# Altium footprint library Module MISC.PcbLib: 27 footprints (part 1 of 2)
Each footprint in its own frame and in the unit in brackets; x right, y up, seen from the top. Pads: shape width x height; smd on the part's side, far side on the other; paste and mask are expansions set on the pad; w line width, h text height; cw(c..) or ccw(c..) is an arc to the next point about the centre after c.
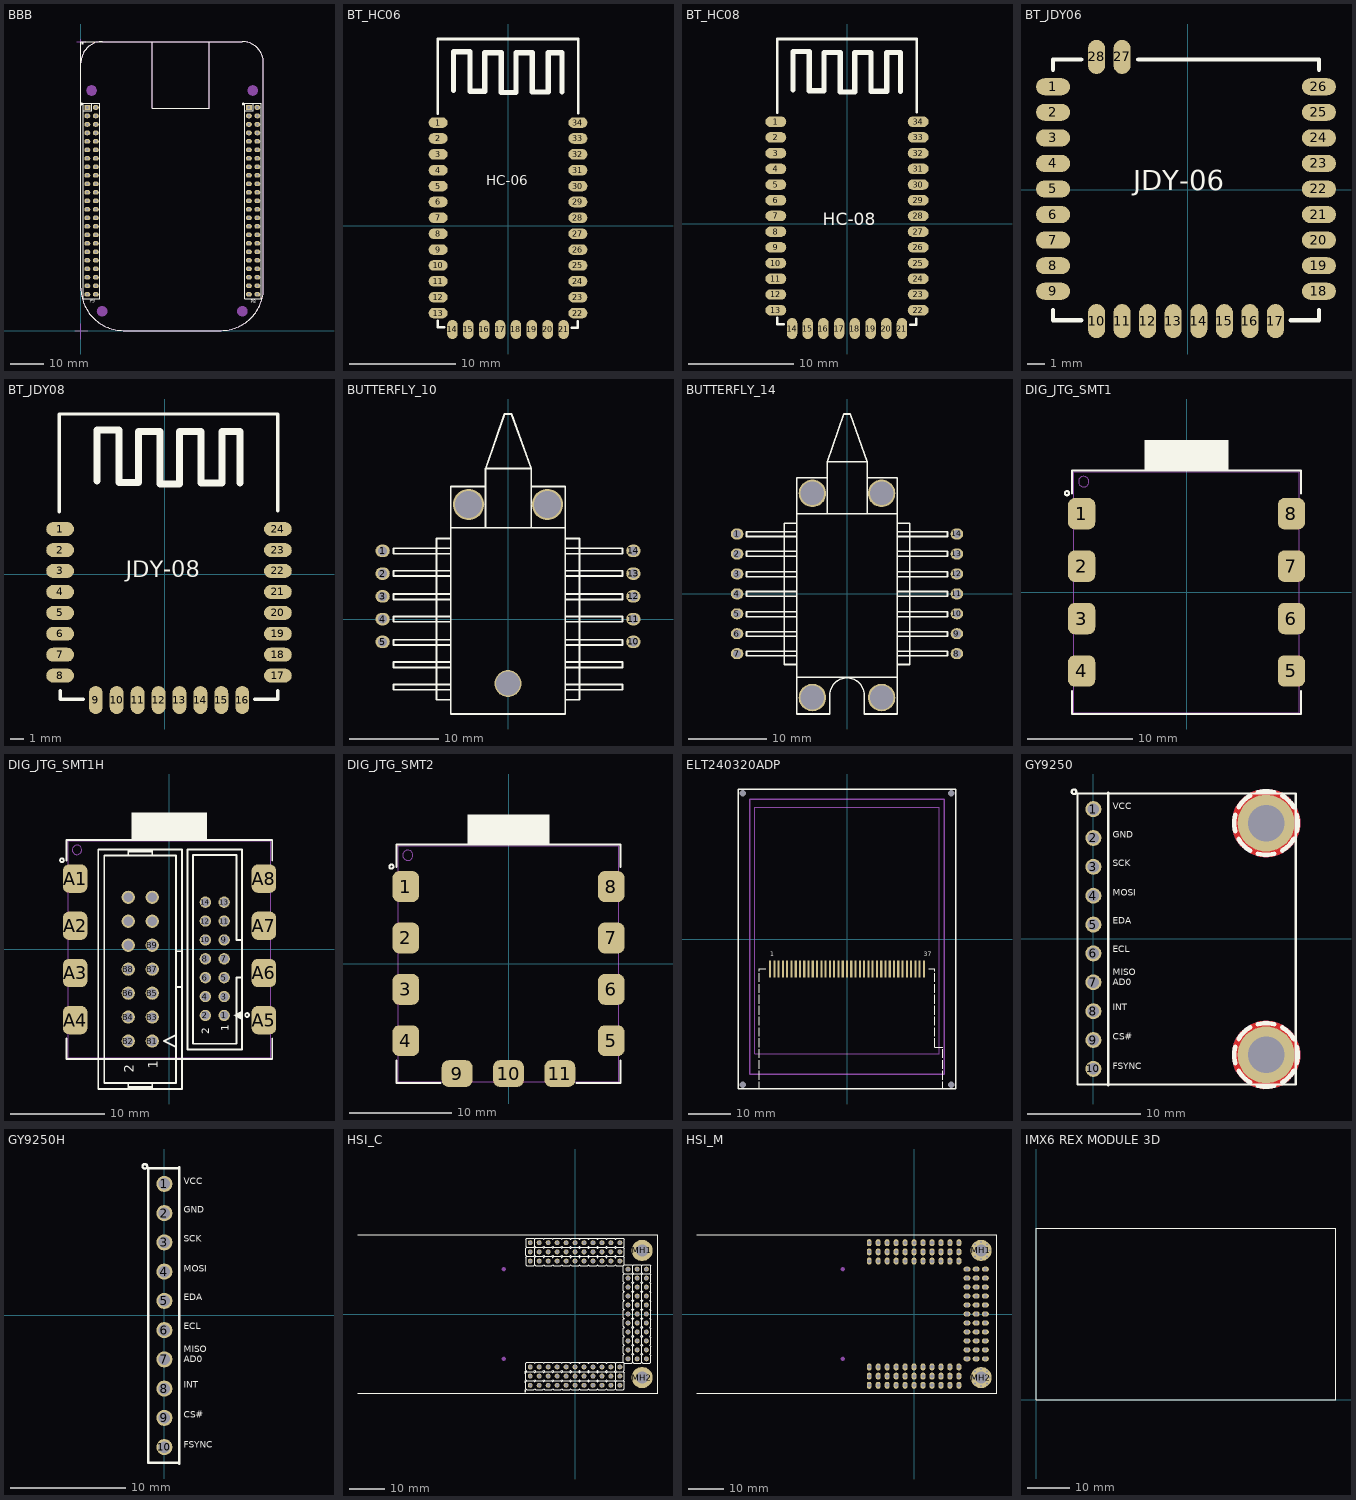
[diagram p0: the footprints below, top view; thin cyan lines are the x and y axes]

## BBB [mm] "BeagleBoneBlack Board"
pads (188):
  round 1 on Mech1: 1(1.93,66.74) 1(50.23,66.74) 2(4.47,66.74) 2(52.77,66.74) 3(1.93,64.2) 3(50.23,64.2) 4(4.47,64.2) 4(52.77,64.2) 5(1.93,61.66) 5(50.23,61.66) 6(4.47,61.66) 6(52.77,61.66) 7(1.93,59.12) 7(50.23,59.12) 8(4.47,59.12) 8(52.77,59.12) 9(1.93,56.58) 9(50.23,56.58) 10(4.47,56.58) 10(52.77,56.58) 11(1.93,54.04) 11(50.23,54.04) 12(4.47,54.04) 12(52.77,54.04) 13(1.93,51.5) 13(50.23,51.5) 14(4.47,51.5) 14(52.77,51.5) 15(1.93,48.96) 15(50.23,48.96) 16(4.47,48.96) 16(52.77,48.96) 17(1.93,46.42) 17(50.23,46.42) 18(4.47,46.42) 18(52.77,46.42) 19(1.93,43.88) 19(50.23,43.88) 20(4.47,43.88) 20(52.77,43.88) 21(1.93,41.34) 21(50.23,41.34) 22(4.47,41.34) 22(52.77,41.34) 23(1.93,38.8) 23(50.23,38.8) 24(4.47,38.8) 24(52.77,38.8) 25(1.93,36.26) 25(50.23,36.26) 26(4.47,36.26) 26(52.77,36.26) 27(1.93,33.72) 27(50.23,33.72) 28(4.47,33.72) 28(52.77,33.72) 29(1.93,31.18) 29(50.23,31.18) 30(4.47,31.18) 30(52.77,31.18) 31(1.93,28.64) 31(50.23,28.64) 32(4.47,28.64) 32(52.77,28.64) 33(1.93,26.1) 33(50.23,26.1) 34(4.47,26.1) 34(52.77,26.1) 35(1.93,23.56) 35(50.23,23.56) 36(4.47,23.56) 36(52.77,23.56) 37(1.93,21.02) 37(50.23,21.02) 38(4.47,21.02) 38(52.77,21.02) 39(1.93,18.48) 39(50.23,18.48) 40(4.47,18.48) 40(52.77,18.48) 41(1.93,15.94) 41(50.23,15.94) 42(4.47,15.94) 42(52.77,15.94) 43(1.93,13.4) 43(50.23,13.4) 44(4.47,13.4) 44(52.77,13.4) 45(1.93,10.86) 45(50.23,10.86) 46(4.47,10.86) 46(52.77,10.86)
  rect 1.8x1.4 / inner rect 1.2x1.2 / far side rect 1.4x1.4 hole 0.8: A1(1.93,66.74) B1(50.23,66.74)
  oval 1.8x1.4 / inner round 1.2 / far side round 1.4 hole 0.8: A2(4.47,66.74) A3(1.93,64.2) A4(4.47,64.2) A5(1.93,61.66) A6(4.47,61.66) A7(1.93,59.12) A8(4.47,59.12) A9(1.93,56.58) A10(4.47,56.58) A11(1.93,54.04) A12(4.47,54.04) A13(1.93,51.5) A14(4.47,51.5) A15(1.93,48.96) A16(4.47,48.96) A17(1.93,46.42) A18(4.47,46.42) A19(1.93,43.88) A20(4.47,43.88) A21(1.93,41.34) A22(4.47,41.34) A23(1.93,38.8) A24(4.47,38.8) A25(1.93,36.26) A26(4.47,36.26) A27(1.93,33.72) A28(4.47,33.72) A29(1.93,31.18) A30(4.47,31.18) A31(1.93,28.64) A32(4.47,28.64) A33(1.93,26.1) A34(4.47,26.1) A35(1.93,23.56) A36(4.47,23.56) A37(1.93,21.02) A38(4.47,21.02) A39(1.93,18.48) A40(4.47,18.48) A41(1.93,15.94) A42(4.47,15.94) A43(1.93,13.4) A44(4.47,13.4) A45(1.93,10.86) A46(4.47,10.86) B2(52.77,66.74) B3(50.23,64.2) B4(52.77,64.2) B5(50.23,61.66) B6(52.77,61.66) B7(50.23,59.12) B8(52.77,59.12) B9(50.23,56.58) B10(52.77,56.58) B11(50.23,54.04) B12(52.77,54.04) B13(50.23,51.5) B14(52.77,51.5) B15(50.23,48.96) B16(52.77,48.96) B17(50.23,46.42) B18(52.77,46.42) B19(50.23,43.88) B20(52.77,43.88) B21(50.23,41.34) B22(52.77,41.34) B23(50.23,38.8) B24(52.77,38.8) B25(50.23,36.26) B26(52.77,36.26) B27(50.23,33.72) B28(52.77,33.72) B29(50.23,31.18) B30(52.77,31.18) B31(50.23,28.64) B32(52.77,28.64) B33(50.23,26.1) B34(52.77,26.1) B35(50.23,23.56) B36(52.77,23.56) B37(50.23,21.02) B38(52.77,21.02) B39(50.23,18.48) B40(52.77,18.48) B41(50.23,15.94) B42(52.77,15.94) B43(50.23,13.4) B44(52.77,13.4) B45(50.23,10.86) B46(52.77,10.86)
  round 3.2 on Mech1: ""(3.2,71.8) ""(6.35,5.8) ""(48.3,5.8) ""(51.4,71.8)
Top Overlay:
  circle w0.2: c0.505,85.915 r0.2
  circle w0.2: c0.2,67.8 r0.2
  circle w0.2: c48.5,67.8 r0.2
  lines w0.2: 0.7,65.8 3.2,65.8 3.2,68 ; 21.3,86.3 21.3,66.5 38.4,66.5 38.4,86.3 ; 49,65.8 51.5,65.8 51.5,68 ; 0,80.05 cw(c6.35,80.05) 6.35,86.4 ; 0,80.05 0,86.4 6.35,86.4 ; 0,80.05 0,12.74 ccw(c12.7,12.74) 12.7,0.04 41.91,0.04 ccw(c41.91,12.74) 54.61,12.74 54.61,80.05 ccw(c48.26,80.05) 48.26,86.4 6.35,86.4 ; 0.7,9.6 0.7,68 5.7,68 5.7,9.6 0.7,9.6 ; 49,9.6 49,68 54,68 54,9.6 49,9.6
  text "P9" at 2.605,8.315 h1
  text "P8" at 50.805,8.115 h1
Bottom Overlay:
  circle w0.2: c0.2,67.85 r0.2
  circle w0.2: c48.5,67.85 r0.2
  lines w0.2: 0.7,65.8 3.1,65.8 3.1,68 ; 49,65.8 51.4,65.8 51.4,68 ; 0.7,9.6 5.7,9.6 5.7,68 0.7,68 0.7,9.6 ; 49,9.6 54,9.6 54,68 49,68 49,9.6
  text "P9" at 4.005,8.315 h1
  text "P8" at 52.205,8.115 h1
Mechanical 1:
  lines w0.2: -1.9,0 2.1,0 ; -1.3,86.4 1.3,86.4 ; 0,-2.5 0,2 ; 0,85.6 0,87.2 ; 21.3,86.3 21.3,66.5 38.4,66.5 38.4,86.3 ; 0,12.74 ccw(c12.7,12.74) 12.7,0.04 41.91,0.04 ccw(c41.91,12.74) 54.61,12.74 54.61,80.05 ccw(c48.26,80.05) 48.26,86.4 6.35,86.4 ccw(c6.35,80.05) 0,80.05 0,12.74
3D body "PIN.STEP": height 8.43, standoff -2.49, extent 51.5,9.59 54.04,12.13
3D body "PIN.STEP": height 8.43, standoff -2.49, extent 48.96,9.59 51.5,12.13
3D body "PIN.STEP": height 8.43, standoff -2.49, extent 51.5,65.47 54.04,68.01
3D body "PIN_mid.STEP": height 8.43, standoff -2.49, extent 48.96,60.39 51.5,62.93
3D body "PIN_mid.STEP": height 8.43, standoff -2.49, extent 48.96,57.85 51.5,60.39
3D body "PIN_mid.STEP": height 8.43, standoff -2.49, extent 48.96,55.31 51.5,57.85
3D body "PIN_mid.STEP": height 8.43, standoff -2.49, extent 48.96,52.77 51.5,55.31
3D body "PIN_mid.STEP": height 8.43, standoff -2.49, extent 48.96,50.23 51.5,52.77
3D body "PIN_mid.STEP": height 8.43, standoff -2.49, extent 48.96,47.69 51.5,50.23
3D body "PIN_mid.STEP": height 8.43, standoff -2.49, extent 48.96,45.15 51.5,47.69
3D body "PIN_mid.STEP": height 8.43, standoff -2.49, extent 48.96,42.61 51.5,45.15
3D body "PIN_mid.STEP": height 8.43, standoff -2.49, extent 48.96,40.07 51.5,42.61
3D body "PIN_mid.STEP": height 8.43, standoff -2.49, extent 48.96,37.53 51.5,40.07
3D body "PIN_mid.STEP": height 8.43, standoff -2.49, extent 48.96,34.99 51.5,37.53
3D body "PIN_mid.STEP": height 8.43, standoff -2.49, extent 48.96,32.45 51.5,34.99
3D body "PIN_mid.STEP": height 8.43, standoff -2.49, extent 48.96,29.91 51.5,32.45
3D body "PIN_mid.STEP": height 8.43, standoff -2.49, extent 48.96,27.37 51.5,29.91
3D body "PIN_mid.STEP": height 8.43, standoff -2.49, extent 48.96,24.83 51.5,27.37
3D body "PIN_mid.STEP": height 8.43, standoff -2.49, extent 48.96,22.29 51.5,24.83
3D body "PIN_mid.STEP": height 8.43, standoff -2.49, extent 48.96,19.75 51.5,22.29
3D body "PIN_mid.STEP": height 8.43, standoff -2.49, extent 48.96,17.21 51.5,19.75
3D body "PIN_mid.STEP": height 8.43, standoff -2.49, extent 48.96,14.67 51.5,17.21
3D body "PIN_mid.STEP": height 8.43, standoff -2.49, extent 48.96,62.93 51.5,65.47
3D body "PIN_mid.STEP": height 8.43, standoff -2.49, extent 51.5,62.93 54.04,65.47
3D body "PIN_mid.STEP": height 8.43, standoff -2.49, extent 51.5,60.39 54.04,62.93
3D body "PIN_mid.STEP": height 8.43, standoff -2.49, extent 51.5,57.85 54.04,60.39
3D body "PIN_mid.STEP": height 8.43, standoff -2.49, extent 51.5,55.31 54.04,57.85
3D body "PIN_mid.STEP": height 8.43, standoff -2.49, extent 51.5,52.77 54.04,55.31
3D body "PIN_mid.STEP": height 8.43, standoff -2.49, extent 51.5,50.23 54.04,52.77
3D body "PIN_mid.STEP": height 8.43, standoff -2.49, extent 51.5,47.69 54.04,50.23
3D body "PIN_mid.STEP": height 8.43, standoff -2.49, extent 51.5,45.15 54.04,47.69
3D body "PIN_mid.STEP": height 8.43, standoff -2.49, extent 51.5,42.61 54.04,45.15
3D body "PIN_mid.STEP": height 8.43, standoff -2.49, extent 51.5,40.07 54.04,42.61
3D body "PIN_mid.STEP": height 8.43, standoff -2.49, extent 51.5,37.53 54.04,40.07
3D body "PIN_mid.STEP": height 8.43, standoff -2.49, extent 51.5,34.99 54.04,37.53
3D body "PIN_mid.STEP": height 8.43, standoff -2.49, extent 51.5,32.45 54.04,34.99
3D body "PIN_mid.STEP": height 8.43, standoff -2.49, extent 51.5,29.91 54.04,32.45
3D body "PIN_mid.STEP": height 8.43, standoff -2.49, extent 51.5,27.37 54.04,29.91
3D body "PIN_mid.STEP": height 8.43, standoff -2.49, extent 51.5,24.83 54.04,27.37
3D body "PIN_mid.STEP": height 8.43, standoff -2.49, extent 51.5,22.29 54.04,24.83
3D body "PIN_mid.STEP": height 8.43, standoff -2.49, extent 51.5,19.75 54.04,22.29
3D body "PIN_mid.STEP": height 8.43, standoff -2.49, extent 51.5,17.21 54.04,19.75
3D body "PIN_mid.STEP": height 8.43, standoff -2.49, extent 51.5,14.67 54.04,17.21
3D body "PIN.STEP": height 8.43, standoff -2.49, extent 48.96,65.47 51.5,68.01
3D body "PIN.STEP": height 8.43, standoff -2.49, extent 48.96,12.13 51.5,14.67
3D body "PIN.STEP": height 8.43, standoff -2.49, extent 51.5,12.13 54.04,14.67
3D body "PIN.STEP": height 8.43, standoff -2.49, extent 3.2,12.13 5.74,14.67
3D body "PIN.STEP": height 8.43, standoff -2.49, extent 0.66,12.13 3.2,14.67
3D body "PIN.STEP": height 8.43, standoff -2.49, extent 0.66,65.47 3.2,68.01
3D body "PIN_mid.STEP": height 8.43, standoff -2.49, extent 3.2,14.67 5.74,17.21
3D body "PIN_mid.STEP": height 8.43, standoff -2.49, extent 3.2,17.21 5.74,19.75
3D body "PIN_mid.STEP": height 8.43, standoff -2.49, extent 3.2,19.75 5.74,22.29
3D body "PIN_mid.STEP": height 8.43, standoff -2.49, extent 3.2,22.29 5.74,24.83
3D body "PIN_mid.STEP": height 8.43, standoff -2.49, extent 3.2,24.83 5.74,27.37
3D body "PIN_mid.STEP": height 8.43, standoff -2.49, extent 3.2,27.37 5.74,29.91
3D body "PIN_mid.STEP": height 8.43, standoff -2.49, extent 3.2,29.91 5.74,32.45
3D body "PIN_mid.STEP": height 8.43, standoff -2.49, extent 3.2,32.45 5.74,34.99
3D body "PIN_mid.STEP": height 8.43, standoff -2.49, extent 3.2,34.99 5.74,37.53
3D body "PIN_mid.STEP": height 8.43, standoff -2.49, extent 3.2,37.53 5.74,40.07
3D body "PIN_mid.STEP": height 8.43, standoff -2.49, extent 3.2,40.07 5.74,42.61
3D body "PIN_mid.STEP": height 8.43, standoff -2.49, extent 3.2,42.61 5.74,45.15
3D body "PIN_mid.STEP": height 8.43, standoff -2.49, extent 3.2,45.15 5.74,47.69
3D body "PIN_mid.STEP": height 8.43, standoff -2.49, extent 3.2,47.69 5.74,50.23
3D body "PIN_mid.STEP": height 8.43, standoff -2.49, extent 3.2,50.23 5.74,52.77
3D body "PIN_mid.STEP": height 8.43, standoff -2.49, extent 3.2,52.77 5.74,55.31
3D body "PIN_mid.STEP": height 8.43, standoff -2.49, extent 3.2,55.31 5.74,57.85
3D body "PIN_mid.STEP": height 8.43, standoff -2.49, extent 3.2,57.85 5.74,60.39
3D body "PIN_mid.STEP": height 8.43, standoff -2.49, extent 3.2,60.39 5.74,62.93
3D body "PIN_mid.STEP": height 8.43, standoff -2.49, extent 3.2,62.93 5.74,65.47
3D body "PIN_mid.STEP": height 8.43, standoff -2.49, extent 0.66,62.93 3.2,65.47
3D body "PIN_mid.STEP": height 8.43, standoff -2.49, extent 0.66,14.67 3.2,17.21
3D body "PIN_mid.STEP": height 8.43, standoff -2.49, extent 0.66,17.21 3.2,19.75
3D body "PIN_mid.STEP": height 8.43, standoff -2.49, extent 0.66,19.75 3.2,22.29
3D body "PIN_mid.STEP": height 8.43, standoff -2.49, extent 0.66,22.29 3.2,24.83
3D body "PIN_mid.STEP": height 8.43, standoff -2.49, extent 0.66,24.83 3.2,27.37
3D body "PIN_mid.STEP": height 8.43, standoff -2.49, extent 0.66,27.37 3.2,29.91
3D body "PIN_mid.STEP": height 8.43, standoff -2.49, extent 0.66,29.91 3.2,32.45
3D body "PIN_mid.STEP": height 8.43, standoff -2.49, extent 0.66,32.45 3.2,34.99
3D body "PIN_mid.STEP": height 8.43, standoff -2.49, extent 0.66,34.99 3.2,37.53
3D body "PIN_mid.STEP": height 8.43, standoff -2.49, extent 0.66,37.53 3.2,40.07
3D body "PIN_mid.STEP": height 8.43, standoff -2.49, extent 0.66,40.07 3.2,42.61
3D body "PIN_mid.STEP": height 8.43, standoff -2.49, extent 0.66,42.61 3.2,45.15
3D body "PIN_mid.STEP": height 8.43, standoff -2.49, extent 0.66,45.15 3.2,47.69
3D body "PIN_mid.STEP": height 8.43, standoff -2.49, extent 0.66,47.69 3.2,50.23
3D body "PIN_mid.STEP": height 8.43, standoff -2.49, extent 0.66,50.23 3.2,52.77
3D body "PIN_mid.STEP": height 8.43, standoff -2.49, extent 0.66,52.77 3.2,55.31
3D body "PIN_mid.STEP": height 8.43, standoff -2.49, extent 0.66,55.31 3.2,57.85
3D body "PIN_mid.STEP": height 8.43, standoff -2.49, extent 0.66,57.85 3.2,60.39
3D body "PIN_mid.STEP": height 8.43, standoff -2.49, extent 0.66,60.39 3.2,62.93
3D body "PIN.STEP": height 8.43, standoff -2.49, extent 3.2,65.47 5.74,68.01
3D body "PIN.STEP": height 8.43, standoff -2.49, extent 0.66,9.59 3.2,12.13
3D body "PIN.STEP": height 8.43, standoff -2.49, extent 3.2,9.59 5.74,12.13
3D body "BEAGLEBONE_BLACK.STEP": height 1.34, standoff -18.03, extent -0.06,-1.625 54.6,88.825

## BT_HC06 [mm] "Bluetooth HC-06"
pads (34):
  oval 1.8x1 smd: 1(-6.6,9.75) 2(-6.6,8.25) 3(-6.6,6.75) 4(-6.6,5.25) 5(-6.6,3.75) 6(-6.6,2.25) 7(-6.6,0.75) 8(-6.6,-0.75) 9(-6.6,-2.25) 10(-6.6,-3.75) 11(-6.6,-5.25) 12(-6.6,-6.75) 13(-6.6,-8.25) 22(6.6,-8.25) 23(6.6,-6.75) 24(6.6,-5.25) 25(6.6,-3.75) 26(6.6,-2.25) 27(6.6,-0.75) 28(6.6,0.75) 29(6.6,2.25) 30(6.6,3.75) 31(6.6,5.25) 32(6.6,6.75) 33(6.6,8.25) 34(6.6,9.75)
  oval 1x1.8 smd: 14(-5.25,-9.8) 15(-3.75,-9.8) 16(-2.25,-9.8) 17(-0.75,-9.8) 18(0.75,-9.8) 19(2.25,-9.8) 20(3.75,-9.8) 21(5.25,-9.8)
Top Overlay:
  lines w0.25: -6.65,-9 -6.65,-9.6 -6.05,-9.6 ; -6.65,10.6 -6.65,17.65 6.65,17.65 6.65,10.65 ; 6.05,-9.65 6.6,-9.65 6.6,-9.05
  lines w0.5: -5.15,12.8 -5.15,16.45 -3.6,16.45 -3.6,12.7 -2.2,12.7 -2.2,16.35 -0.65,16.35 -0.65,12.6 0.75,12.6 0.75,16.35 2.3,16.35 2.3,12.65 3.8,12.65 3.8,16.35 5.1,16.35 5.1,12.65
  text "HC-06" at -2.05,3.5 h1.6
3D body "BLUETOOTH-HC-06 Package.STEP": height 4.3, standoff 0, extent -6.5,-9.5 6.5,17.5

## BT_HC08 [mm] "Bluetooth HC-08"
pads (34):
  oval 2x1 smd: 1(-6.8,9.75) 2(-6.8,8.25) 3(-6.8,6.75) 4(-6.8,5.25) 5(-6.8,3.75) 6(-6.8,2.25) 7(-6.8,0.75) 8(-6.8,-0.75) 9(-6.8,-2.25) 10(-6.8,-3.75) 11(-6.8,-5.25) 12(-6.8,-6.75) 13(-6.8,-8.25) 22(6.8,-8.25) 23(6.8,-6.75) 24(6.8,-5.25) 25(6.8,-3.75) 26(6.8,-2.25) 27(6.8,-0.75) 28(6.8,0.75) 29(6.8,2.25) 30(6.8,3.75) 31(6.8,5.25) 32(6.8,6.75) 33(6.8,8.25) 34(6.8,9.75)
  oval 1x2 smd: 14(-5.25,-10) 15(-3.75,-10) 16(-2.25,-10) 17(-0.75,-10) 18(0.75,-10) 19(2.25,-10) 20(3.75,-10) 21(5.25,-10)
Top Overlay:
  lines w0.25: -6.65,-9 -6.65,-9.6 -6.05,-9.6 ; -6.65,10.6 -6.65,17.65 6.65,17.65 6.65,10.65 ; 6.05,-9.65 6.6,-9.65 6.6,-9.05
  lines w0.5: -5.15,12.8 -5.15,16.45 -3.6,16.45 -3.6,12.7 -2.2,12.7 -2.2,16.35 -0.65,16.35 -0.65,12.6 0.75,12.6 0.75,16.35 2.3,16.35 2.3,12.65 3.8,12.65 3.8,16.35 5.1,16.35 5.1,12.65
  text "HC-08" at -2.3,-0.5 h2
3D body "BLUETOOTH-HC-06 Package.STEP": height 4.3, standoff 0, extent -6.5,-9.5 6.5,17.5

## BT_JDY06 [mm]
pads (28):
  oval 2x1 smd: 1(-7.9,6.05) 2(-7.9,4.55) 3(-7.9,3.05) 4(-7.9,1.55) 5(-7.9,0.05) 6(-7.9,-1.45) 7(-7.9,-2.95) 8(-7.9,-4.45) 9(-7.9,-5.95) 18(7.7,-5.95) 19(7.7,-4.45) 20(7.7,-2.95) 21(7.7,-1.45) 22(7.7,0.05) 23(7.7,1.55) 24(7.7,3.05) 25(7.7,4.55) 26(7.7,6.05)
  oval 1x2 smd: 10(-5.35,-7.7) 11(-3.85,-7.7) 12(-2.35,-7.7) 13(-0.85,-7.7) 14(0.65,-7.7) 15(2.15,-7.7) 16(3.65,-7.7) 17(5.15,-7.7) 27(-3.85,7.8) 28(-5.35,7.8)
Top Overlay:
  lines w0.25: -7.9,-7.65 -7.9,-7.05 ; -7.9,7.05 -7.9,7.65 ; -7.85,-7.65 -6.25,-7.65 ; -7.85,7.65 -6.25,7.65 ; -2.9,7.65 7.65,7.65 ; 6.05,-7.65 7.65,-7.65 ; 7.7,-7.65 7.7,-7.05 ; 7.7,7.05 7.7,7.65
  text "JDY-06" at -3.2,-0.4 h2
3D body: height 2, standoff 0, extent -7.606,-7.3 7.406,7.4

## BT_JDY08 [mm]
pads (24):
  oval 2x1 smd: 1(-7.5,3.25) 2(-7.5,1.75) 3(-7.5,0.25) 4(-7.5,-1.25) 5(-7.5,-2.75) 6(-7.5,-4.25) 7(-7.5,-5.75) 8(-7.5,-7.25) 17(8.1,-7.25) 18(8.1,-5.75) 19(8.1,-4.25) 20(8.1,-2.75) 21(8.1,-1.25) 22(8.1,0.25) 23(8.1,1.75) 24(8.1,3.25)
  oval 1x2 smd: 9(-4.95,-9) 10(-3.45,-9) 11(-1.95,-9) 12(-0.45,-9) 13(1.05,-9) 14(2.55,-9) 15(4.05,-9) 16(5.55,-9)
Top Overlay:
  lines w0.25: -7.55,4.5 -7.55,11.5 8.1,11.5 8.1,4.55 ; -7.5,-8.95 -7.5,-8.35 ; -7.45,-8.95 -5.85,-8.95 ; 6.45,-8.95 8.05,-8.95 ; 8.1,-8.95 8.1,-8.35
  lines w0.5: -4.85,6.7 -4.85,10.35 -3.3,10.35 -3.3,6.6 -1.9,6.6 -1.9,10.25 -0.35,10.25 -0.35,6.5 1.05,6.5 1.05,10.25 2.6,10.25 2.6,6.55 4.1,6.55 4.1,10.25 5.4,10.25 5.4,6.55
  text "JDY-08" at -2.8,-0.6 h2
3D body "JDY-08.stp": height 2.08, standoff 0, extent -7.2,-8.7 7.811,11.188

## BUTTERFLY_10 [mm] "Butterfly Laser Module 10pin"
pads (13):
  oval 1.6x1.4 / inner round 1.4 / far side oval 2.2x1.4 hole 1: 1(-14,7.62) 2(-14,5.08) 3(-14,2.54) 4(-14,0) 5(-14,-2.54) 10(14,-2.54) 11(14,0) 12(14,2.54) 13(14,5.08) 14(14,7.62)
  round 3.5 / inner round 3.5 / far side round 5 hole 3: ""(-4.4,12.8) ""(4.4,12.8)
  round 3 / inner round 3 / far side round 5 hole 2.7: ""(0,-7.2)
Top Overlay:
  lines w0.2: -6.4,-9 -8,-9 -8,9 -6.4,9 ; -6.4,-7.9 -12.8,-7.9 -12.8,-7.3 -6.4,-7.3 ; -6.4,-5.4 -12.8,-5.4 -12.8,-4.8 -6.4,-4.8 ; -6.4,-2.9 -12.8,-2.9 -12.8,-2.3 -6.4,-2.3 ; -6.4,-0.3 -12.8,-0.3 -12.8,0.3 -6.4,0.3 ; -6.4,2.2 -12.8,2.2 -12.8,2.8 -6.4,2.8 ; -6.4,4.8 -12.8,4.8 -12.8,5.4 -6.4,5.4 ; -6.4,7.3 -12.8,7.3 -12.8,7.9 -6.4,7.9 ; -6.4,10.2 6.4,10.2 ; -2.5,10.2 -2.5,16.8 ; -2.5,14.8 -6.4,14.8 -6.4,-10.6 6.4,-10.6 6.4,14.8 2.6,14.8 ; 2.6,10.2 2.6,16.8 ; 6.4,-9 8,-9 8,9 6.4,9 ; 6.4,-7.9 12.8,-7.9 12.8,-7.3 6.4,-7.3 ; 6.4,-5.4 12.8,-5.4 12.8,-4.8 6.4,-4.8 ; 6.4,-2.9 12.8,-2.9 12.8,-2.3 6.4,-2.3 ; 6.4,-0.3 12.8,-0.3 12.8,0.3 6.4,0.3 ; 6.4,2.2 12.8,2.2 12.8,2.8 6.4,2.8 ; 6.4,4.8 12.8,4.8 12.8,5.4 6.4,5.4 ; 6.4,7.3 12.8,7.3 12.8,7.9 6.4,7.9 ; -2.5,16.8 -0.4,22.9 0.4,22.9 2.6,16.8 ; -2.5,16.8 2.6,16.8
3D body "User Library-Butterfly-14-Lead.step": height 9.51, standoff 0, extent -26.65,-15.2 26.65,40.7

## BUTTERFLY_14 [mm] "Butterfly Laser Module 14pin"
pads (18):
  oval 1.6x1.4 / inner round 1.4 / far side oval 2.2x1.4 hole 1: 1(-14,7.62) 2(-14,5.08) 3(-14,2.54) 4(-14,0) 5(-14,-2.54) 6(-14,-5.08) 7(-14,-7.62) 8(14,-7.62) 9(14,-5.08) 10(14,-2.54) 11(14,0) 12(14,2.54) 13(14,5.08) 14(14,7.62)
  round 3.5 / inner round 3.5 / far side round 5 hole 3: ""(-4.4,-13.2) ""(-4.4,12.8) ""(4.4,-13.2) ""(4.4,12.8)
Top Overlay:
  lines w0.2: -6.4,-10.6 6.4,-10.6 ; -6.4,-9 -8,-9 -8,9 -6.4,9 ; -6.4,-7.9 -12.8,-7.9 -12.8,-7.3 -6.4,-7.3 ; -6.4,-5.4 -12.8,-5.4 -12.8,-4.8 -6.4,-4.8 ; -6.4,-2.9 -12.8,-2.9 -12.8,-2.3 -6.4,-2.3 ; -6.4,-0.3 -12.8,-0.3 -12.8,0.3 -6.4,0.3 ; -6.4,2.2 -12.8,2.2 -12.8,2.8 -6.4,2.8 ; -6.4,4.8 -12.8,4.8 -12.8,5.4 -6.4,5.4 ; -6.4,7.3 -12.8,7.3 -12.8,7.9 -6.4,7.9 ; -6.4,10.2 6.4,10.2 ; -2.5,10.2 -2.5,16.8 ; -2.5,14.8 -6.4,14.8 -6.4,-15.3 -2.2,-15.3 -2.2,-12.9 cw(c0,-12.9) 2.2,-12.9 2.2,-15.3 6.4,-15.3 6.4,14.8 2.6,14.8 ; 2.6,10.2 2.6,16.8 ; 6.4,-9 8,-9 8,9 6.4,9 ; 6.4,-7.9 12.8,-7.9 12.8,-7.3 6.4,-7.3 ; 6.4,-5.4 12.8,-5.4 12.8,-4.8 6.4,-4.8 ; 6.4,-2.9 12.8,-2.9 12.8,-2.3 6.4,-2.3 ; 6.4,-0.3 12.8,-0.3 12.8,0.3 6.4,0.3 ; 6.4,2.2 12.8,2.2 12.8,2.8 6.4,2.8 ; 6.4,4.8 12.8,4.8 12.8,5.4 6.4,5.4 ; 6.4,7.3 12.8,7.3 12.8,7.9 6.4,7.9 ; -2.5,16.8 -0.4,22.9 0.4,22.9 2.6,16.8 ; -2.5,16.8 2.6,16.8
3D body "User Library-Butterfly-14-Lead.step": height 9.51, standoff 0, extent -26.65,-15.2 26.65,40.7

## DIG_JTG_SMT1 [mm] "DIGILENT JTAG MODULE USB STM1"
height 3
pads (8):
  rrect50% 2.6x3 smd: 1(-10,7.5) 2(-10,2.5) 3(-10,-2.5) 4(-10,-7.5) 5(10,-7.5) 6(10,-2.5) 7(10,2.5) 8(10,7.5)
Top Overlay:
  circle w0.2: c-11.4,9.449 r0.2
  region: -4,14.5 -4,11.5 4,11.5 4,14.5
  lines w0.2: -10.9,-9.425 -10.9,-11.6 10.9,-11.6 10.9,-9.425 ; -10.9,9.425 -10.9,11.6 10.9,11.6 10.9,9.425
Mechanical 13:
  circle w0.1: c-9.8,10.55 r0.5
  lines w0.1: -10.75,-11.5 -10.75,11.5 10.75,11.5 10.75,-11.5 -10.75,-11.5
3D body: height 3, standoff 0, extent -10.75,-11.5 10.75,11.5

## DIG_JTG_SMT1H [mm] "DIGILENT JTAG MODULE USB STM1"
height 3
pads (36):
  round 1.2 / inner round 1.2 / far side oval 1.6x1.2 hole 0.9: 1(5.8,-7) 2(3.8,-7) 3(5.8,-5) 4(3.8,-5) 5(5.8,-3) 6(3.8,-3) 7(5.8,-1) 8(3.8,-1) 9(5.8,1) 10(3.8,1) 11(5.8,3) 12(3.8,3) 13(5.8,5) 14(3.8,5)
  rrect50% 2.6x3 smd: A1(-10,7.5) A2(-10,2.5) A3(-10,-2.5) A4(-10,-7.5) A5(10,-7.5) A6(10,-2.5) A7(10,2.5) A8(10,7.5)
  round 1.4 / inner round 1.4 / far side oval 2.2x1.4 hole 1 mask+0.1: B1(-1.83,-9.72) B2(-4.37,-9.72) B3(-1.83,-7.18) B4(-4.37,-7.18) B5(-1.83,-4.64) B6(-4.37,-4.64) B7(-1.83,-2.1) B8(-4.37,-2.1) B9(-1.83,0.44) B10(-4.37,0.44) B11(-1.83,2.98) B12(-4.37,2.98) B13(-1.83,5.52) B14(-4.37,5.52)
Top Overlay:
  circle w0.2: c8.23,-6.96 r0.2
  circle w0.2: c-11.4,9.449 r0.2
  region: -4,14.5 -4,11.5 4,11.5 4,14.5
  region: 7.7,-6.5 6.8,-7 7.7,-7.5
  lines w0.2: -10.9,-9.425 -10.9,-11.6 10.9,-11.6 10.9,-9.425 ; -10.9,9.425 -10.9,11.6 10.9,11.6 10.9,9.425 ; -4.37,-14.8 -4.37,-14.165 ; -4.37,-14.588 -1.83,-14.588 ; -4.37,9.965 -4.37,10.6 ; -4.37,10.388 -1.83,10.388 ; -1.83,-14.8 -1.83,-14.165 ; -1.83,9.965 -1.83,10.6 ; 0.71,-10.355 -0.56,-9.72 0.71,-9.085 ; 1.345,-4.005 0.71,-4.005 ; 1.345,-0.195 0.71,-0.195 ; 7.7,-3 7.1,-3 7.1,-10 2.5,-10 2.5,10 7.1,10 7.1,1 7.7,1 ; 0.71,-4.005 0.71,-14.165 -6.91,-14.165 -6.91,9.965 0.71,9.965 0.71,-0.195 ; 0.71,-4.005 0.71,-0.195 ; -7.545,-14.8 1.345,-14.8 1.345,10.6 -7.545,10.6 -7.545,-14.8 ; 1.9,-10.6 1.9,10.6 7.7,10.6 7.7,-10.6 1.9,-10.6
  text "1" at -1.246,-12.641 h1
  text "2" at -3.76,-13.073 h1
  text "1" at 6.3,-8.7 h0.8
  text "2" at 4.2,-9 h0.8
Mechanical 13:
  circle w0.1: c-9.8,10.55 r0.5
  lines w0.1: -10.75,-11.5 10.75,-11.5 10.75,11.5 -10.75,11.5 -10.75,-11.5
3D body "TE_1-1634688-4_IDC14_V.STEP": height 9.1, standoff -3.2, extent -7.65,-14.83 1.45,10.6
3D body "header_awhw214g-0202.stp": height 5.75, standoff -2.8, extent 2.05,-10.5 7.55,10.5

## DIG_JTG_SMT2 [mm] "DIGILENT JTAG MODULE USB STM2"
height 0.7
pads (11):
  rrect50% 2.6x3 smd: 1(-10,7.5) 2(-10,2.5) 3(-10,-2.5) 4(-10,-7.5) 5(10,-7.5) 6(10,-2.5) 7(10,2.5) 8(10,7.5)
  rrect50% 3x2.6 smd: 9(-5,-10.7) 10(0,-10.7) 11(5,-10.7)
Top Overlay:
  circle w0.2: c-11.4,9.449 r0.2
  region: -4,14.5 -4,11.5 4,11.5 4,14.5
  lines w0.2: -10.9,-9.425 -10.9,-11.6 -6.6,-11.6 ; -10.9,9.425 -10.9,11.6 10.9,11.6 10.9,9.425 ; 6.6,-11.6 10.9,-11.6 10.9,-9.425
Mechanical 13:
  circle w0.1: c-9.8,10.55 r0.5
  lines w0.1: -10.75,-11.5 -10.75,11.5 10.75,11.5 10.75,-11.5 -10.75,-11.5
3D body: height 3, standoff 0, extent -10.75,-11.5 10.75,11.5

## ELT240320ADP [mm] "ELT240320ADP , 2.8 Inch TFT LED with Touch Screen , 37 Leads with 1mm Pitch"
pads (41):
  rect 0.5x4 smd: 1(-18,-7) 2(-17,-7) 3(-16,-7) 4(-15,-7) 5(-14,-7) 6(-13,-7) 7(-12,-7) 8(-11,-7) 9(-10,-7) 10(-9,-7) 11(-8,-7) 12(-7,-7) 13(-6,-7) 14(-5,-7) 15(-4,-7) 16(-3,-7) 17(-2,-7) 18(-1,-7) 19(0,-7) 20(1,-7) 21(2,-7) 22(3,-7) 23(4,-7) 24(5,-7) 25(6,-7) 26(7,-7) 27(8,-7) 28(9,-7) 29(10,-7) 30(11,-7) 31(12,-7) 32(13,-7) 33(14,-7) 34(15,-7) 35(16,-7) 36(17,-7) 37(18,-7)
  rect 0x0 hole 1.5: MH(-24.4,-34.125) MH(-24.4,34.125) MH(24.4,-34.125) MH(24.4,34.125)
Top Overlay:
  lines w0.254: -20.5,-34.792 -20.5,-33.416 ; -20.5,-32.908 -20.5,-30.876 ; -20.5,-30.368 -20.5,-28.336 ; -20.5,-27.828 -20.5,-25.796 ; -20.5,-25.288 -20.5,-23.256 ; -20.5,-22.748 -20.5,-20.716 ; -20.5,-20.208 -20.5,-18.176 ; -20.5,-17.668 -20.5,-15.636 ; -20.5,-15.128 -20.5,-13.096 ; -20.5,-12.588 -20.5,-10.556 ; -20.5,-10.048 -20.5,-8.016 ; -20.5,-7.508 -20.5,-6.992 -19.016,-6.992 ; 19.084,-6.992 20.5,-6.992 20.5,-7.508 ; 20.5,-25.292 22.4,-25.292 ; 20.5,-25.288 20.5,-23.256 ; 20.5,-22.748 20.5,-20.716 ; 20.5,-20.208 20.5,-18.176 ; 20.5,-17.668 20.5,-15.636 ; 20.5,-15.128 20.5,-13.096 ; 20.5,-12.588 20.5,-10.556 ; 20.5,-10.048 20.5,-8.016 ; 22.4,-35.1 22.4,-33.416 ; 22.4,-32.908 22.4,-30.876 ; 22.4,-30.368 22.4,-28.336 ; 22.4,-27.828 22.4,-25.796
  lines w0.3: -25.5,-35.1 25.5,-35.1 25.5,35.1 -25.5,35.1 -25.5,-35.1
  text "1" at -18,-4 h1
  text "37" at 18,-4 h1
Mechanical 1:
  lines w0.254: -21.6,-26.8 21.6,-26.8 21.6,30.8 -21.6,30.8 -21.6,-26.8
  lines w0.3: -22.75,-31.65 22.75,-31.65 22.75,32.65 -22.75,32.65 -22.75,-31.65
  text "Active Area" at -21,29.2 h1
  text "Touch Area" at -5.55,-31.05 h1
3D body: height 4.05, standoff 0.8, extent -25,-34.6 25,34.6

## GY9250 [mm] "GY-9250, MPU-9250 Module"
pads (12):
  round 1.4 / inner round 1.4 / far side oval 2.2x1.4 hole 1 mask+0.1: 1(0,11.43) 2(0,8.89) 3(0,6.35) 4(0,3.81) 5(0,1.27) 6(0,-1.27) 7(0,-3.81) 8(0,-6.35) 9(0,-8.89) 10(0,-11.43)
  round 5 / inner round 3.5 / far side round 5 hole 3.2 mask+0.1: ""(15.2,-10.2) ""(15.2,10.2)
Top Layer:
  pour cut-out: 15.2,13.2 15.003,13.2 14.613,13.149 14.234,13.047 13.87,12.896 13.53,12.7 13.218,12.46 12.94,12.182 12.7,11.87 12.504,11.53 12.353,11.166 12.251,10.787 12.2,10.397 12.2,10.2 12.2,10.003 12.251,9.613 12.353,9.234 12.504,8.87 12.7,8.53 12.94,8.218 13.218,7.94 13.53,7.7 13.87,7.504 14.234,7.353 14.613,7.251 15.003,7.2 15.2,7.2 15.397,7.2 15.787,7.251 16.166,7.353 16.53,7.504 16.87,7.7 17.182,7.94 17.46,8.218 17.7,8.53 17.896,8.87 18.047,9.234 18.149,9.613 18.2,10.003 18.2,10.2 18.2,10.397 18.149,10.787 18.047,11.166 17.896,11.53 17.7,11.87 17.46,12.182 17.182,12.46 16.87,12.7 16.53,12.896 16.166,13.047 15.787,13.149 15.397,13.2
  pour cut-out: 12.2,-10.2 12.2,-10.397 12.251,-10.787 12.353,-11.166 12.504,-11.53 12.7,-11.87 12.94,-12.182 13.218,-12.46 13.53,-12.7 13.87,-12.896 14.234,-13.047 14.613,-13.149 15.003,-13.2 15.2,-13.2 15.397,-13.2 15.787,-13.149 16.166,-13.047 16.53,-12.896 16.87,-12.7 17.182,-12.46 17.46,-12.182 17.7,-11.87 17.896,-11.53 18.047,-11.166 18.149,-10.787 18.2,-10.397 18.2,-10.2 18.2,-10.003 18.149,-9.613 18.047,-9.234 17.896,-8.87 17.7,-8.53 17.46,-8.218 17.182,-7.94 16.87,-7.7 16.53,-7.504 16.166,-7.353 15.787,-7.251 15.397,-7.2 15.2,-7.2 15.003,-7.2 14.613,-7.251 14.234,-7.353 13.87,-7.504 13.53,-7.7 13.218,-7.94 12.94,-8.218 12.7,-8.53 12.504,-8.87 12.353,-9.234 12.251,-9.613 12.2,-10.003
Bottom Layer:
  pour cut-out: 15.2,13.2 15.003,13.2 14.613,13.149 14.234,13.047 13.87,12.896 13.53,12.7 13.218,12.46 12.94,12.182 12.7,11.87 12.504,11.53 12.353,11.166 12.251,10.787 12.2,10.397 12.2,10.2 12.2,10.003 12.251,9.613 12.353,9.234 12.504,8.87 12.7,8.53 12.94,8.218 13.218,7.94 13.53,7.7 13.87,7.504 14.234,7.353 14.613,7.251 15.003,7.2 15.2,7.2 15.397,7.2 15.787,7.251 16.166,7.353 16.53,7.504 16.87,7.7 17.182,7.94 17.46,8.218 17.7,8.53 17.896,8.87 18.047,9.234 18.149,9.613 18.2,10.003 18.2,10.2 18.2,10.397 18.149,10.787 18.047,11.166 17.896,11.53 17.7,11.87 17.46,12.182 17.182,12.46 16.87,12.7 16.53,12.896 16.166,13.047 15.787,13.149 15.397,13.2
  pour cut-out: 12.2,-10.2 12.2,-10.397 12.251,-10.787 12.353,-11.166 12.504,-11.53 12.7,-11.87 12.94,-12.182 13.218,-12.46 13.53,-12.7 13.87,-12.896 14.234,-13.047 14.613,-13.149 15.003,-13.2 15.2,-13.2 15.397,-13.2 15.787,-13.149 16.166,-13.047 16.53,-12.896 16.87,-12.7 17.182,-12.46 17.46,-12.182 17.7,-11.87 17.896,-11.53 18.047,-11.166 18.149,-10.787 18.2,-10.397 18.2,-10.2 18.2,-10.003 18.149,-9.613 18.047,-9.234 17.896,-8.87 17.7,-8.53 17.46,-8.218 17.182,-7.94 16.87,-7.7 16.53,-7.504 16.166,-7.353 15.787,-7.251 15.397,-7.2 15.2,-7.2 15.003,-7.2 14.613,-7.251 14.234,-7.353 13.87,-7.504 13.53,-7.7 13.218,-7.94 12.94,-8.218 12.7,-8.53 12.504,-8.87 12.353,-9.234 12.251,-9.613 12.2,-10.003
Top Overlay:
  circle w0.2: c-1.7,12.96 r0.2
  lines w0.2: 1.3,-12.9 1.3,12.9 ; -1.4,-12.8 -1.4,12.8 17.8,12.8 17.8,-12.8 -1.4,-12.8
  lines w0.4: 12.495,-10.925 cw(c15.2,-10.2) 12.495,-9.475 ; 12.495,9.475 cw(c15.2,10.2) 12.495,10.925 ; 12.775,-11.6 ccw(c15.2,-10.2) 13.8,-12.625 ; 12.775,-8.8 cw(c15.2,-10.2) 13.8,-7.775 ; 12.775,8.8 ccw(c15.2,10.2) 13.8,7.775 ; 12.775,11.6 cw(c15.2,10.2) 13.8,12.625 ; 14.475,-12.905 ccw(c15.2,-10.2) 15.925,-12.905 ; 14.475,-7.495 cw(c15.2,-10.2) 15.925,-7.495 ; 14.475,7.495 ccw(c15.2,10.2) 15.925,7.495 ; 14.475,12.905 cw(c15.2,10.2) 15.925,12.905 ; 16.6,-12.625 ccw(c15.2,-10.2) 17.625,-11.6 ; 16.6,-7.775 cw(c15.2,-10.2) 17.625,-8.8 ; 16.6,7.775 ccw(c15.2,10.2) 17.625,8.8 ; 16.6,12.625 cw(c15.2,10.2) 17.625,11.6 ; 17.905,-10.925 ccw(c15.2,-10.2) 17.905,-9.475 ; 17.905,9.475 ccw(c15.2,10.2) 17.905,10.925
  text "MISO" at 1.7,-3.4 h1
  text "VCC" at 1.7,11.2 h1
  text "GND" at 1.7,8.7 h1
  text "SCK" at 1.7,6.2 h1
  text "MOSI" at 1.7,3.6 h1
  text "EDA" at 1.7,1.1 h1
  text "ECL" at 1.7,-1.4 h1
  text "AD0" at 1.7,-4.3 h1
  text "INT" at 1.7,-6.5 h1
  text "CS#" at 1.7,-9.1 h1
  text "FSYNC" at 1.7,-11.7 h1
3D body "MPU-9250.step": height 14.2, standoff 2.27, extent -1.3,-12.7 17.7,12.7
3D body "female_header_a-bl254-eg-g03d.stp": height 8.5, standoff -3.2, extent -1.3,-2.665 1.2,5.205
3D body "female_header_a-bl254-eg-g03d.stp": height 8.5, standoff -3.2, extent -1.3,4.955 1.2,12.825
3D body "female_header_a-bl254-eg-g02d.stp": height 8.5, standoff -3.2, extent -1.3,-7.745 1.2,-2.415
3D body "female_header_a-bl254-eg-g02d.stp": height 8.5, standoff -3.2, extent -1.3,-12.825 1.2,-7.495

## GY9250H [mm] "GY-9250, MPU-9250 Module"
pads (10):
  round 1.4 / inner round 1.4 / far side oval 2.2x1.4 hole 1 mask+0.1: 1(0,11.43) 2(0,8.89) 3(0,6.35) 4(0,3.81) 5(0,1.27) 6(0,-1.27) 7(0,-3.81) 8(0,-6.35) 9(0,-8.89) 10(0,-11.43)
Top Overlay:
  circle w0.2: c-1.7,12.96 r0.2
  lines w0.2: 1.3,-12.9 1.3,12.9 ; 1.3,-12.8 -1.4,-12.8 -1.4,12.8 1.3,12.8
  text "FSYNC" at 1.7,-11.7 h1
  text "CS#" at 1.7,-9.1 h1
  text "INT" at 1.7,-6.5 h1
  text "AD0" at 1.7,-4.3 h1
  text "ECL" at 1.7,-1.4 h1
  text "EDA" at 1.7,1.1 h1
  text "MOSI" at 1.7,3.6 h1
  text "SCK" at 1.7,6.2 h1
  text "GND" at 1.7,8.7 h1
  text "VCC" at 1.7,11.2 h1
  text "MISO" at 1.7,-3.4 h1
3D body "female_header_a-bl254-eg-g02d.stp": height 8.5, standoff -3.2, extent -1.3,-12.825 1.2,-7.495
3D body "female_header_a-bl254-eg-g02d.stp": height 8.5, standoff -3.2, extent -1.3,-7.745 1.2,-2.415
3D body "female_header_a-bl254-eg-g03d.stp": height 8.5, standoff -3.2, extent -1.3,4.955 1.2,12.825
3D body "female_header_a-bl254-eg-g03d.stp": height 8.5, standoff -3.2, extent -1.3,-2.665 1.2,5.205
3D body "MPU-9250.step": height 14.2, standoff 2.27, extent -1.3,-12.7 17.7,12.7

## HSI_C [mm] "CHILA_High.Speed.Interface_CARRIER, FEMALE"
pads (103):
  oct 1.4x1.4 / inner round 1.4 / far side oct 1.4x2 hole 1 mask+0.1: BA1(-12.7,-15)
  round 1.4 / inner round 1.4 / far side oval 1.4x2 hole 1 mask+0.1: BA2(-10.16,-15) BA3(-7.62,-15) BA4(-5.08,-15) BA5(-2.54,-15) BA6(0,-15) BA7(2.54,-15) BA8(5.08,-15) BA9(7.62,-15) BA10(10.16,-15) BA11(12.7,-15) BB1(-12.7,-17.6) BB2(-10.16,-17.6) BB3(-7.62,-17.6) BB4(-5.08,-17.6) BB5(-2.54,-17.6) BB6(0,-17.6) BB7(2.54,-17.6) BB8(5.08,-17.6) BB9(7.62,-17.6) BB10(10.16,-17.6) BB11(12.7,-17.6) BC1(-12.7,-20.2) BC2(-10.16,-20.2) BC3(-7.62,-20.2) BC4(-5.08,-20.2) BC5(-2.54,-20.2) BC6(0,-20.2) BC7(2.54,-20.2) BC8(5.08,-20.2) BC9(7.62,-20.2) BC10(10.16,-20.2) BC11(12.7,-20.2) TA1(12.7,15) TA2(10.16,15) TA3(7.62,15) TA4(5.08,15) TA5(2.54,15) TA6(0,15) TA7(-2.54,15) TA8(-5.08,15) TA9(-7.62,15) TA10(-10.16,15) TA11(-12.7,15) TB1(12.7,17.6) TB2(10.16,17.6) TB3(7.62,17.6) TB4(5.08,17.6) TB5(2.54,17.6) TB6(0,17.6) TB7(-2.54,17.6) TB8(-5.08,17.6) TB9(-7.62,17.6) TB10(-10.16,17.6) TB11(-12.7,17.6) TC1(12.7,20.2) TC2(10.16,20.2) TC3(7.62,20.2) TC4(5.08,20.2) TC5(2.54,20.2) TC6(0,20.2) TC7(-2.54,20.2) TC8(-5.08,20.2) TC9(-7.62,20.2) TC10(-10.16,20.2) TC11(-12.7,20.2)
  round 1.4 / inner round 1.4 / far side oval 2x1.4 hole 1 mask+0.1: CA1(15,-12.7) CA2(15,-10.16) CA3(15,-7.62) CA4(15,-5.08) CA5(15,-2.54) CA6(15,0) CA7(15,2.54) CA8(15,5.08) CA9(15,7.62) CA10(15,10.16) CA11(15,12.7) CB1(17.6,-12.7) CB2(17.6,-10.16) CB3(17.6,-7.62) CB4(17.6,-5.08) CB5(17.6,-2.54) CB6(17.6,0) CB7(17.6,2.54) CB8(17.6,5.08) CB9(17.6,7.62) CB10(17.6,10.16) CB11(17.6,12.7) CC1(20.2,-12.7) CC2(20.2,-10.16) CC3(20.2,-7.62) CC4(20.2,-5.08) CC5(20.2,-2.54) CC6(20.2,0) CC7(20.2,2.54) CC8(20.2,5.08) CC9(20.2,7.62) CC10(20.2,10.16) CC11(20.2,12.7)
  round 6 hole 3.5 mask+0.1: MH1(19,18) MH2(19,-18)
  round 1.2 on Mech1 mask+0.1: ""(-20.2,-12.7) ""(-20.2,12.7)
Top Overlay:
  drawing of 625 lines, arcs and shapes, not listed
3D body "female_header_a-bl254-eg-g03d.stp": height 8.5, standoff -3.2, extent -1.395,19 6.475,21.5
3D body "female_header_a-bl254-eg-g03d.stp": height 8.5, standoff -3.2, extent 6.225,19 14.095,21.5
3D body "female_header_a-bl254-eg-g02d.stp": height 8.5, standoff -3.2, extent -14.095,19 -8.765,21.5
3D body "female_header_a-bl254-eg-g03d.stp": height 8.5, standoff -3.2, extent -9.015,19 -1.145,21.5
3D body "female_header_a-bl254-eg-g03d.stp": height 8.5, standoff -3.2, extent -9.015,16.4 -1.145,18.9
3D body "female_header_a-bl254-eg-g02d.stp": height 8.5, standoff -3.2, extent -14.095,16.4 -8.765,18.9
3D body "female_header_a-bl254-eg-g03d.stp": height 8.5, standoff -3.2, extent 6.225,16.4 14.095,18.9
3D body "female_header_a-bl254-eg-g03d.stp": height 8.5, standoff -3.2, extent -1.395,16.4 6.475,18.9
3D body "female_header_a-bl254-eg-g03d.stp": height 8.5, standoff -3.2, extent -9.015,13.8 -1.145,16.3
3D body "female_header_a-bl254-eg-g02d.stp": height 8.5, standoff -3.2, extent -14.095,13.8 -8.765,16.3
3D body "female_header_a-bl254-eg-g03d.stp": height 8.5, standoff -3.2, extent 6.225,13.8 14.095,16.3
3D body "female_header_a-bl254-eg-g03d.stp": height 8.5, standoff -3.2, extent -1.395,13.8 6.475,16.3
3D body "female_header_a-bl254-eg-g03d.stp": height 8.5, standoff -3.2, extent 19,-6.475 21.5,1.395
3D body "female_header_a-bl254-eg-g03d.stp": height 8.5, standoff -3.2, extent 19,-14.095 21.5,-6.225
3D body "female_header_a-bl254-eg-g02d.stp": height 8.5, standoff -3.2, extent 19,8.765 21.5,14.095
3D body "female_header_a-bl254-eg-g03d.stp": height 8.5, standoff -3.2, extent 19,1.145 21.5,9.015
3D body "female_header_a-bl254-eg-g03d.stp": height 8.5, standoff -3.2, extent 16.4,1.145 18.9,9.015
3D body "female_header_a-bl254-eg-g02d.stp": height 8.5, standoff -3.2, extent 16.4,8.765 18.9,14.095
3D body "female_header_a-bl254-eg-g03d.stp": height 8.5, standoff -3.2, extent 16.4,-14.095 18.9,-6.225
3D body "female_header_a-bl254-eg-g03d.stp": height 8.5, standoff -3.2, extent 16.4,-6.475 18.9,1.395
3D body "female_header_a-bl254-eg-g03d.stp": height 8.5, standoff -3.2, extent 13.8,1.145 16.3,9.015
3D body "female_header_a-bl254-eg-g02d.stp": height 8.5, standoff -3.2, extent 13.8,8.765 16.3,14.095
3D body "female_header_a-bl254-eg-g03d.stp": height 8.5, standoff -3.2, extent 13.8,-14.095 16.3,-6.225
3D body "female_header_a-bl254-eg-g03d.stp": height 8.5, standoff -3.2, extent 13.8,-6.475 16.3,1.395
3D body "female_header_a-bl254-eg-g03d.stp": height 8.5, standoff -3.2, extent -6.475,-16.3 1.395,-13.8
3D body "female_header_a-bl254-eg-g03d.stp": height 8.5, standoff -3.2, extent -14.095,-16.3 -6.225,-13.8
3D body "female_header_a-bl254-eg-g02d.stp": height 8.5, standoff -3.2, extent 8.765,-16.3 14.095,-13.8
3D body "female_header_a-bl254-eg-g03d.stp": height 8.5, standoff -3.2, extent 1.145,-16.3 9.015,-13.8
3D body "female_header_a-bl254-eg-g03d.stp": height 8.5, standoff -3.2, extent -6.475,-18.9 1.395,-16.4
3D body "female_header_a-bl254-eg-g03d.stp": height 8.5, standoff -3.2, extent -14.095,-18.9 -6.225,-16.4
3D body "female_header_a-bl254-eg-g02d.stp": height 8.5, standoff -3.2, extent 8.765,-18.9 14.095,-16.4
3D body "female_header_a-bl254-eg-g03d.stp": height 8.5, standoff -3.2, extent 1.145,-18.9 9.015,-16.4
3D body "female_header_a-bl254-eg-g03d.stp": height 8.5, standoff -3.2, extent 1.145,-21.5 9.015,-19
3D body "female_header_a-bl254-eg-g02d.stp": height 8.5, standoff -3.2, extent 8.765,-21.5 14.095,-19
3D body "female_header_a-bl254-eg-g03d.stp": height 8.5, standoff -3.2, extent -14.095,-21.5 -6.225,-19
3D body "female_header_a-bl254-eg-g03d.stp": height 8.5, standoff -3.2, extent -6.475,-21.5 1.395,-19

## HSI_M [mm] "CHILA_High.Speed.Interface_MODULE, MALE"
pads (103):
  oct 1.4x2 / inner round 1.4 / far side oct 1.4x1.4 hole 1 mask+0.1: BA1(-12.7,-15)
  oval 1.4x2 / inner round 1.4 / far side round 1.4 hole 1 mask+0.1: BA2(-10.16,-15) BA3(-7.62,-15) BA4(-5.08,-15) BA5(-2.54,-15) BA6(0,-15) BA7(2.54,-15) BA8(5.08,-15) BA9(7.62,-15) BA10(10.16,-15) BA11(12.7,-15) BB1(-12.7,-17.6) BB2(-10.16,-17.6) BB3(-7.62,-17.6) BB4(-5.08,-17.6) BB5(-2.54,-17.6) BB6(0,-17.6) BB7(2.54,-17.6) BB8(5.08,-17.6) BB9(7.62,-17.6) BB10(10.16,-17.6) BB11(12.7,-17.6) BC1(-12.7,-20.2) BC2(-10.16,-20.2) BC3(-7.62,-20.2) BC4(-5.08,-20.2) BC5(-2.54,-20.2) BC6(0,-20.2) BC7(2.54,-20.2) BC8(5.08,-20.2) BC9(7.62,-20.2) BC10(10.16,-20.2) BC11(12.7,-20.2) TA1(12.7,15) TA2(10.16,15) TA3(7.62,15) TA4(5.08,15) TA5(2.54,15) TA6(0,15) TA7(-2.54,15) TA8(-5.08,15) TA9(-7.62,15) TA10(-10.16,15) TA11(-12.7,15) TB1(12.7,17.6) TB2(10.16,17.6) TB3(7.62,17.6) TB4(5.08,17.6) TB5(2.54,17.6) TB6(0,17.6) TB7(-2.54,17.6) TB8(-5.08,17.6) TB9(-7.62,17.6) TB10(-10.16,17.6) TB11(-12.7,17.6) TC1(12.7,20.2) TC2(10.16,20.2) TC3(7.62,20.2) TC4(5.08,20.2) TC5(2.54,20.2) TC6(0,20.2) TC7(-2.54,20.2) TC8(-5.08,20.2) TC9(-7.62,20.2) TC10(-10.16,20.2) TC11(-12.7,20.2)
  oval 2x1.4 / inner round 1.4 / far side round 1.4 hole 1 mask+0.1: CA1(15,-12.7) CA2(15,-10.16) CA3(15,-7.62) CA4(15,-5.08) CA5(15,-2.54) CA6(15,0) CA7(15,2.54) CA8(15,5.08) CA9(15,7.62) CA10(15,10.16) CA11(15,12.7) CB1(17.6,-12.7) CB2(17.6,-10.16) CB3(17.6,-7.62) CB4(17.6,-5.08) CB5(17.6,-2.54) CB6(17.6,0) CB7(17.6,2.54) CB8(17.6,5.08) CB9(17.6,7.62) CB10(17.6,10.16) CB11(17.6,12.7) CC1(20.2,-12.7) CC2(20.2,-10.16) CC3(20.2,-7.62) CC4(20.2,-5.08) CC5(20.2,-2.54) CC6(20.2,0) CC7(20.2,2.54) CC8(20.2,5.08) CC9(20.2,7.62) CC10(20.2,10.16) CC11(20.2,12.7)
  round 6 hole 3.5 mask+0.1: MH1(19,18) MH2(19,-18)
  round 1.2 on Mech1 mask+0.1: ""(-20.2,-12.7) ""(-20.2,12.7)
via 16.6,-18 diameter 0.8 hole 0.5
via 17.303,-16.303 diameter 0.8 hole 0.5
via 19,-15.6 diameter 0.8 hole 0.5
via 20.697,-16.303 diameter 0.8 hole 0.5
via 21.4,-18 diameter 0.8 hole 0.5
via 20.697,-19.697 diameter 0.8 hole 0.5
via 19,-20.4 diameter 0.8 hole 0.5
via 17.303,-19.697 diameter 0.8 hole 0.5
via 17.303,19.697 diameter 0.8 hole 0.5
via 19,20.4 diameter 0.8 hole 0.5
via 20.697,19.697 diameter 0.8 hole 0.5
via 21.4,18 diameter 0.8 hole 0.5
via 20.697,16.303 diameter 0.8 hole 0.5
via 19,15.6 diameter 0.8 hole 0.5
via 17.303,16.303 diameter 0.8 hole 0.5
via 16.6,18 diameter 0.8 hole 0.5
Top Overlay:
  lines w0.2: -61.5,-22.5 23.5,-22.5 23.5,22.5 -61.5,22.5
Bottom Overlay:
  drawing of 622 lines, arcs and shapes, not listed
3D body "User Library-Header_Male_1Pin.STEP": height 8.54, standoff -3, extent -13.97,-16.245 -11.43,-13.755
3D body "User Library-Header_Male_10Pin.STEP": height 8.54, standoff -3, extent -11.43,-16.3 13.97,-13.81
3D body "User Library-Header_Male_1Pin.STEP": height 8.54, standoff -3, extent -13.97,-18.845 -11.43,-16.355
3D body "User Library-Header_Male_10Pin.STEP": height 8.54, standoff -3, extent -11.43,-18.9 13.97,-16.41
3D body "User Library-Header_Male_1Pin.STEP": height 8.54, standoff -3, extent -13.97,-21.445 -11.43,-18.955
3D body "User Library-Header_Male_10Pin.STEP": height 8.54, standoff -3, extent -11.43,-21.5 13.97,-19.01
3D body "User Library-Header_Male_1Pin.STEP": height 8.54, standoff -3, extent 18.956,11.43 21.445,13.97
3D body "User Library-Header_Male_10Pin.STEP": height 8.54, standoff -3, extent 18.901,-13.97 21.39,11.43
3D body "User Library-Header_Male_1Pin.STEP": height 8.54, standoff -3, extent 16.356,11.43 18.845,13.97
3D body "User Library-Header_Male_10Pin.STEP": height 8.54, standoff -3, extent 16.301,-13.97 18.791,11.43
3D body "User Library-Header_Male_1Pin.STEP": height 8.54, standoff -3, extent 13.756,11.43 16.245,13.97
3D body "User Library-Header_Male_10Pin.STEP": height 8.54, standoff -3, extent 13.701,-13.97 16.191,11.43
3D body "User Library-Header_Male_1Pin.STEP": height 8.54, standoff -3, extent 11.43,13.755 13.97,16.245
3D body "User Library-Header_Male_10Pin.STEP": height 8.54, standoff -3, extent -13.97,13.81 11.43,16.3
3D body "User Library-Header_Male_1Pin.STEP": height 8.54, standoff -3, extent 11.43,16.355 13.97,18.845
3D body "User Library-Header_Male_10Pin.STEP": height 8.54, standoff -3, extent -13.97,16.41 11.43,18.9
3D body "User Library-Header_Male_1Pin.STEP": height 8.54, standoff -3, extent 11.43,18.955 13.97,21.445
3D body "User Library-Header_Male_10Pin.STEP": height 8.54, standoff -3, extent -13.97,19.01 11.43,21.5

## IMX6 REX MODULE 3D [mm]
Top Overlay:
  lines w0.2: 0,0 69.977,0 69.977,40.005 0,40.005 0,0
3D body "iMX6 Rex_V1I1_PCB(Prototype) - 18-OCT-2013.step": height 9.6, standoff 1.61, extent 0,0 70,40